# Altium footprint library cool_library.PcbLib: 1182 footprints (part 42 of 75)
Each footprint in its own frame and in the unit in brackets; x right, y up, seen from the top. Pads: shape width x height; smd on the part's side, far side on the other; paste and mask are expansions set on the pad; w line width, h text height; cw(c..) or ccw(c..) is an arc to the next point about the centre after c.
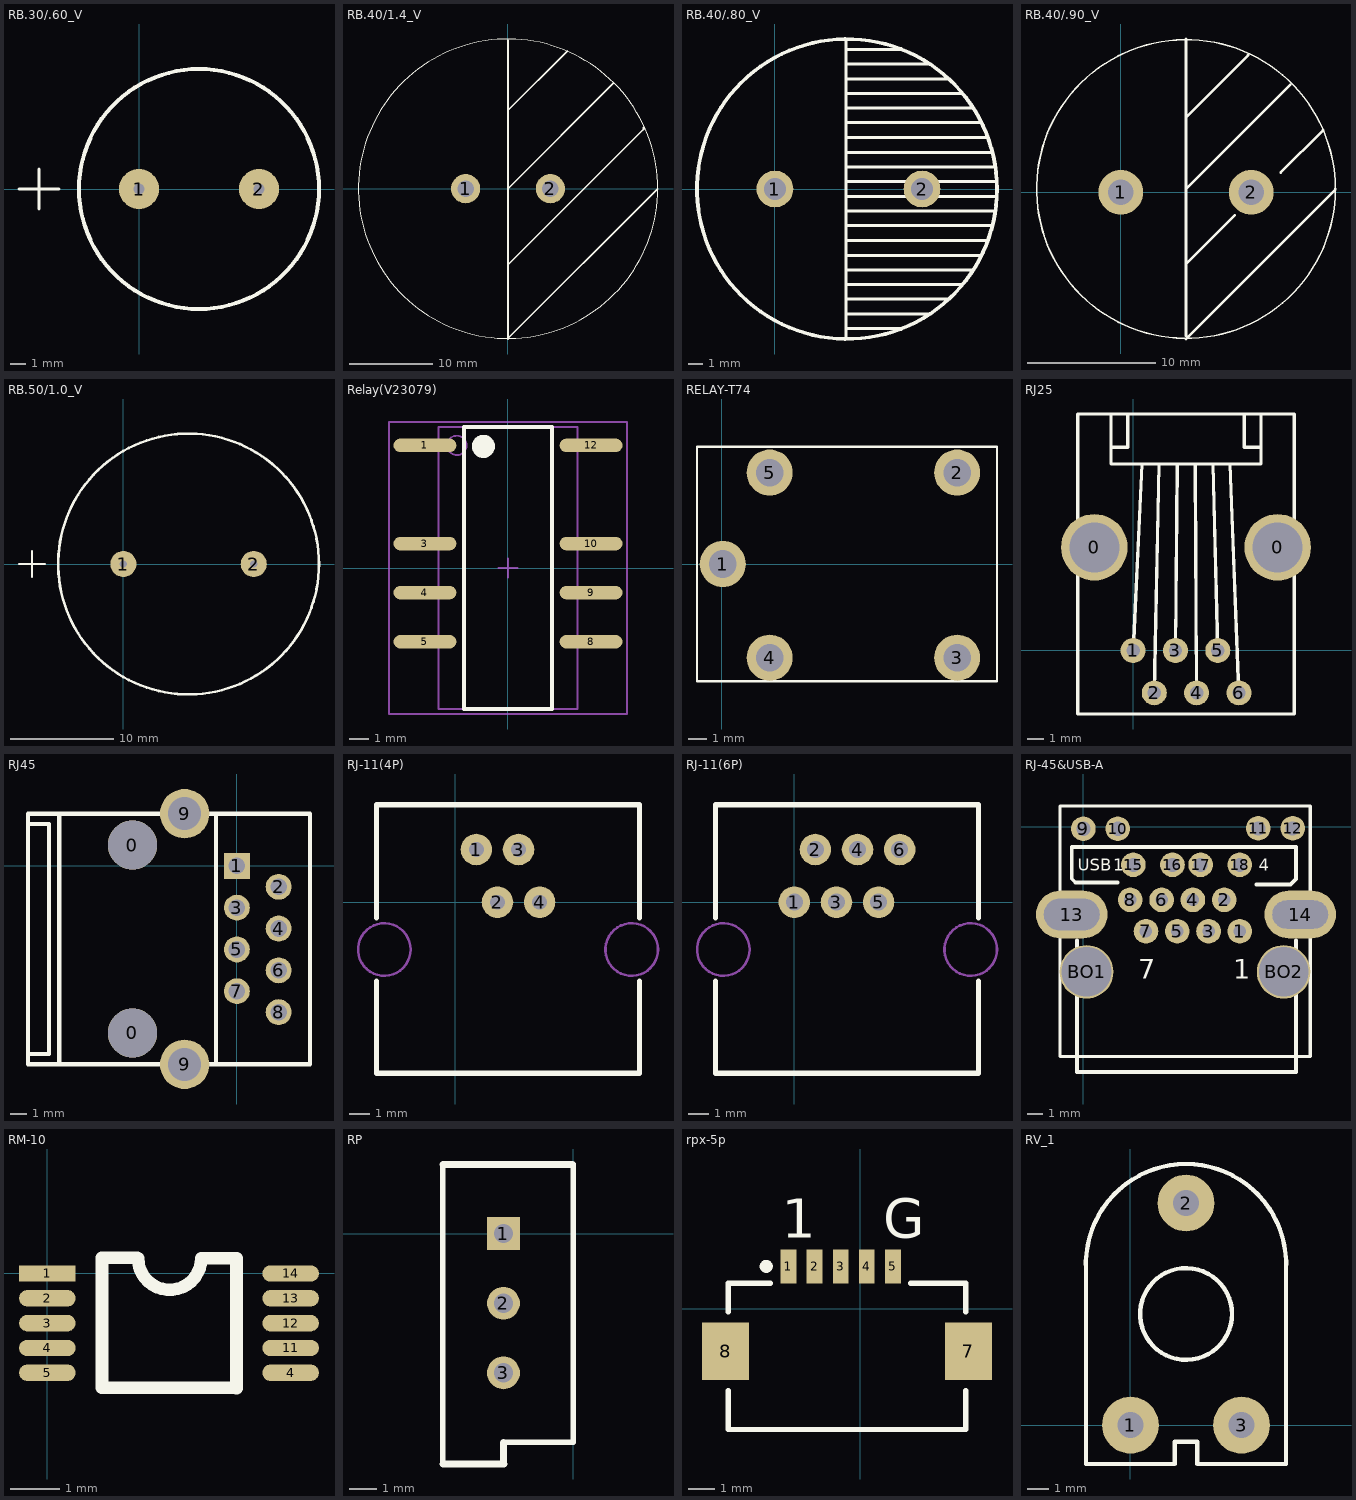
[diagram p41: the footprints below, top view; thin cyan lines are the x and y axes]

## RB.30/.60_V [mil]
pads (2):
  round 100 hole 28: 1(0,0) 2(300,0)
Top Overlay:
  circle w10: c150,0 r300
  lines w8: -300,0 -200,0 ; -250,-50 -250,50

## RB.40/1.4_V [mm]
pads (2):
  round 3.5 hole 2: 1(-5.08,0) 2(5.08,0)
Top Overlay:
  circle w0.127: c0,0 r17.961
  lines w0.203: 0,-9.144 16.256,7.112 16.256,7.366 ; 0,0 12.7,12.7 ; 0,9.144 0,9.398 7.112,16.51 ; 0,17.78 0,-18.034 0,-17.961 17.961,0

## RB.40/.80_V [mm]
pads (2):
  round 2.5 hole 1.5: 1(0,0) 2(10,0)
Top Overlay:
  circle w0.254: c4.9,0 r10.2
  lines w0.203: 4.84,-10.16 4.84,10.16 ; 4.84,-9.5 8.574,-9.5 ; 4.84,-8.509 10.555,-8.509 ; 4.84,-7.493 11.8,-7.493 ; 4.84,-6.502 12.79,-6.502 ; 4.84,-5.512 13.527,-5.512 ; 4.84,-4.521 14.06,-4.521 ; 4.84,-3.505 14.467,-3.505 ; 4.84,-2.489 14.797,-2.489 ; 4.84,-1.499 15,-1.499 ; 4.84,-0.508 15.076,-0.508 ; 4.84,0.508 15.076,0.508 ; 4.84,1.499 15,1.499 ; 4.84,2.489 14.797,2.489 ; 4.84,3.505 14.467,3.505 ; 4.84,4.521 14.06,4.521 ; 4.84,5.512 13.527,5.512 ; 4.84,6.502 12.79,6.502 ; 4.84,7.493 11.8,7.493 ; 4.84,8.509 10.555,8.509 ; 4.84,9.5 8.574,9.5

## RB.40/.90_V [mm]
pads (2):
  round 3.5 hole 2: 1(0,0) 2(10.16,0)
Top Overlay:
  circle w0.127: c5.08,0.254 r11.634
  lines w0.203: 5.08,-11.43 16.714,0.204 16.714,0.254 ; 5.08,-11.176 5.08,11.938 ; 5.08,-5.588 8.89,-1.778 ; 5.08,0.254 13.208,8.382 ; 5.08,5.842 9.906,10.668 ; 12.446,1.524 15.748,4.826

## RB.50/1.0_V [mil]
pads (2):
  round 100 hole 28: 1(0,0) 2(500,0)
Top Overlay:
  circle w10: c250,0 r500
  lines w8: -400,0 -300,0 ; -350,-50 -350,50

## Relay(V23079) [mm]
pads (8):
  oval 3.25x0.7 smd: 1(-4.3,6.35) 3(-4.3,1.27) 4(-4.3,-1.27) 5(-4.3,-3.81) 8(4.3,-3.81) 9(4.3,-1.27) 10(4.3,1.27) 12(4.3,6.35)
Top Overlay:
  circle w0.6: c-1.275,6.3 r0.3
  lines w0.2: -2.275,-7.3 -2.275,7.3 2.275,7.3 2.275,-7.3 -2.275,-7.3
Mechanical 13:
  circle w0.1: c-2.65,6.35 r0.5
  lines w0.1: -3.6,-7.3 -3.6,7.3 3.6,7.3 3.6,-7.3 -3.6,-7.3
Mechanical 15:
  lines w0.1: -0.5,0 0.5,0 ; 0,-0.5 0,0.5 ; -6.15,-7.55 -6.15,7.55 6.15,7.55 6.15,-7.55 -6.15,-7.55

## RELAY-T74 [mm]
pads (5):
  round 2.5 hole 1.5: 1(0.051,0) 2(12.751,4.953) 3(12.751,-5.08) 4(2.591,-5.08) 5(2.591,4.953)
Top Overlay:
  lines w0.127: -1.346,-6.35 -1.346,6.35 14.91,6.35 14.91,-6.35 -1.346,-6.35

## RJ25 [mm]
pads (8):
  round 4 hole 3: 0(-2.327,6.19) 0(8.673,6.19)
  round 1.5 hole 0.8: 1(0,0) 2(1.27,-2.54) 3(2.54,0) 4(3.81,-2.54) 5(5.08,0) 6(6.35,-2.54)
Top Overlay:
  lines w0.203: -1.327,12.19 -0.327,12.19 -0.327,14.19 ; -1.327,14.19 -1.327,11.19 7.673,11.19 7.673,14.19 ; 0,0 0.533,11.19 ; 1.27,-2.54 1.549,11.19 ; 2.54,0 2.642,11.19 ; 3.729,11.19 3.805,-2.54 ; 4.796,11.19 5.075,0 ; 5.812,11.19 6.345,-2.54 ; 6.673,14.19 6.673,12.19 7.673,12.19 ; -3.327,-3.81 9.673,-3.81 9.673,14.19 -3.327,14.19 -3.327,-3.81

## RJ45 [mil]
pads (12):
  round 118.11 hole 118.11: 0(-250,-400) 0(-250,50)
  rect 62x62 hole 40: 1(0,0)
  round 62 hole 40: 2(100,-50) 3(0,-100) 4(100,-150) 5(0,-200) 6(100,-250) 7(0,-300) 8(100,-350)
  round 118.11 hole 78.74: 9(-125,-475) 9(-125,125)
Top Overlay:
  lines w10: -500,-450 -450,-450 -450,100 -500,100 ; -425,-475 -425,125 ; -50,-475 -50,125 ; -500,-475 -500,125 175,125 175,-475 -500,-475

## RJ-11(4P) [mil]
pads (4):
  round 60 hole 28: 1(40,100) 2(80,0) 3(120,100) 4(160,0)
Top Overlay:
  lines w10: -150,-150 -150,-325 350,-325 350,-150 ; -150,-30 -150,185 350,185 350,-30
Mechanical 1:
  circle w5: c335,-90 r50
  circle w5: c-135,-90 r50

## RJ-11(6P) [mil]
pads (6):
  round 60 hole 32: 1(0,0) 2(40,100) 3(80,0) 4(120,100) 5(160,0) 6(200,100)
Top Overlay:
  lines w10: -150,-150 -150,-325 350,-325 350,-150 ; -150,-30 -150,185 350,185 350,-30
Mechanical 1:
  circle w5: c335,-90 r50
  circle w5: c-135,-90 r50

## RJ-45&USB-A [mil]
pads (20):
  round 62 hole 31.5: 1(394,-263) 2(354.63,-184.26) 3(315.26,-263) 4(275.89,-184.26) 5(236.52,-263) 6(197.15,-184.26) 7(157.78,-263) 8(118.41,-184.26)
  round 62 hole 35.43: 9(0.3,-5.13) 10(86.91,-5.13) 11(440.39,-4) 12(527,-4)
  oval 180x120 hole 80 slot 140 at 0 deg: 13(-29,-221)
  oval 180x120 hole 70.87 slot 140 at 0 deg: 14(546,-221)
  round 62 hole 35: 15(126,-96) 16(224.43,-96) 17(295.29,-96) 18(393.72,-96)
  round 135 hole 125: BO1(8.17,-365.36) BO2(504.24,-365.36)
Top Overlay:
  lines w8: -58.76,-577.96 -58.76,51.96 571.17,51.96 571.17,-577.96 -58.76,-577.96
  lines w10: -15.73,-286 -15.73,-617.18 535.45,-617.18 535.45,-286 ; 86,-141 -19,-141 -29,-131 -29,-121 -29,-51 535.45,-51 535.45,-131.55 521,-146 ; 436,-146 521,-146 ; 531,-136 521,-146
  text "1" at 377.78,-383 h50
  text "7" at 137.78,-383 h50
  text "USB" at -14,-111 h30
  text "1" at 76,-111 h30
  text "4" at 441,-111 h30

## RM-10 [mm]
pads (10):
  rect 1.143x0.33 smd: 1(0,0)
  oval 1.143x0.33 smd: 2(0,-0.5) 3(0,-1) 4(0,-1.5) 4(4.9,-2) 5(0,-2) 11(4.9,-1.5) 12(4.9,-1) 13(4.9,-0.5) 14(4.9,0)
Top Overlay:
  lines w0.254: 1.814,0.32 1.1,0.32 1.1,-2.3 3.799,-2.3 ; 1.829,0.305 ccw(c2.464,0.305) 3.099,0.305 3.806,0.305 ; 3.81,-2.311 3.81,0.309

## RP [mm]
pads (3):
  rect 1.2x1.2 hole 0.7: 1(-2.54,0)
  round 1.2 hole 0.7: 2(-2.54,-2.54) 3(-2.54,-5.08)
Top Overlay:
  lines w0.2: -4.75,-8.407 -4.75,2.515 ; -2.54,-7.62 0,-7.62 0,2.54
  lines w0.254: -4.75,-8.407 -2.515,-8.407 -2.54,-8.382 -2.54,-7.62 ; -4.75,2.515 -0.025,2.515

## rpx-5p [mm] "Connector; FH12 Series; 6 Position; 1.0mm Spaced Bottom Eccentric Contact"
height 2
pads (7):
  rect 0.6x1.3 smd: 1(-2.75,1.625) 2(-1.75,1.625) 3(-0.75,1.625) 4(0.25,1.625) 5(1.25,1.625)
  rect 1.8x2.2 smd: 7(4.134,-1.625) 8(-5.15,-1.625)
Top Overlay:
  circle w0.25: c-3.6,1.625 r0.125
  lines w0.2: -5.05,-3.125 -5.05,-4.625 4.034,-4.625 4.034,-3.125 ; -5.05,-0.125 -5.05,0.975 -3.45,0.975 ; 1.934,0.975 4.034,0.975 4.034,-0.125
  text "1" at -3,2.725 h1.5
  text "G" at 0.889,2.718 h1.5

## RV_1 [mm]
pads (3):
  round 2.6 hole 1.2: 1(0,0) 2(2.54,10.16) 3(5.08,0)
Top Overlay:
  circle w0.2: c2.543,5.085 r2.1
  lines w0.2: -2.032,-1.778 2.032,-1.778 2.032,-0.762 3.048,-0.762 3.048,-1.778 7.112,-1.778 7.112,7.112 ccw(c2.54,7.366) -2.032,7.112 -2.032,-1.778